# Altium footprint library ThanhNT.PcbLib: 579 footprints (part 21 of 37)
Each footprint in its own frame and in the unit in brackets; x right, y up, seen from the top. Pads: shape width x height; smd on the part's side, far side on the other; paste and mask are expansions set on the pad; w line width, h text height; cw(c..) or ccw(c..) is an arc to the next point about the centre after c.
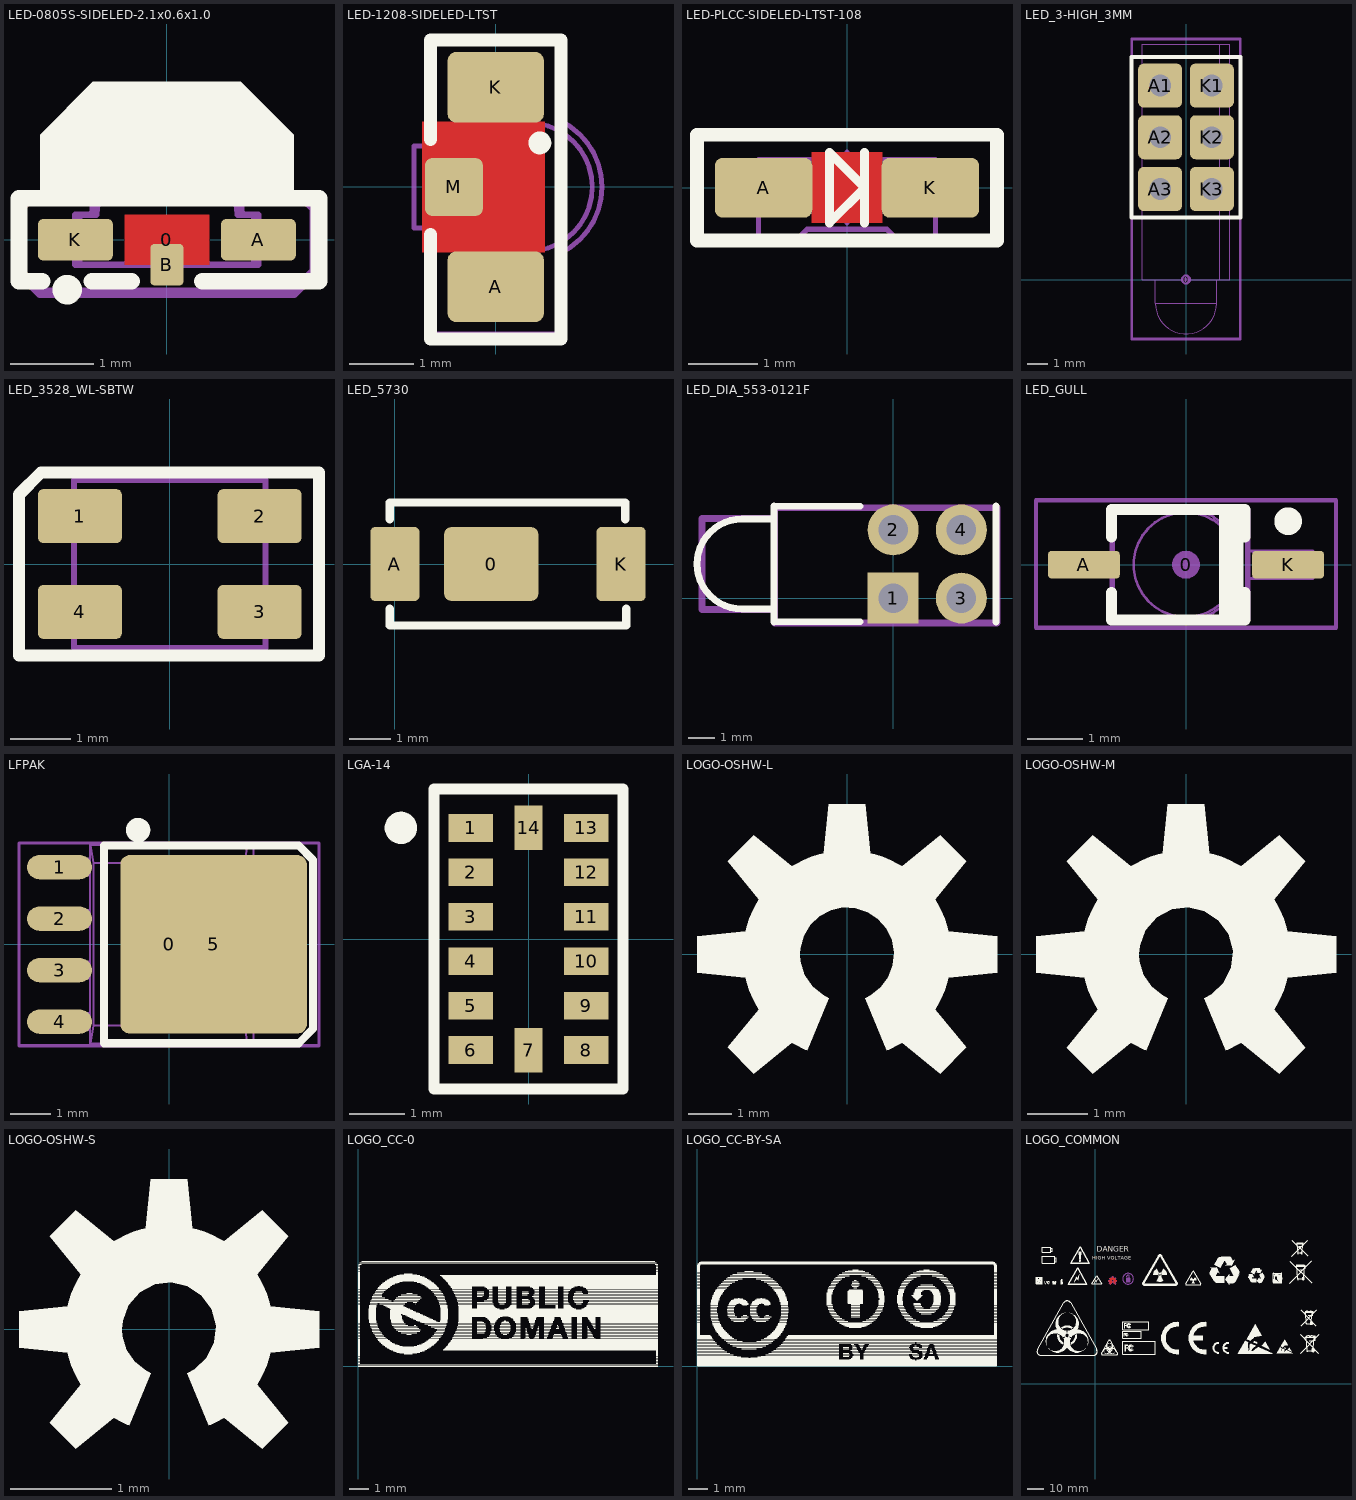
[diagram p20: the footprints below, top view; thin cyan lines are the x and y axes]

## LED-0805S-SIDELED-2.1x0.6x1.0 [mm] "Lite-On Inc PLCC Side LED"
height 0.8
pads (4):
  round 0.508 on Mech15: 0(0,0)
  rrect25% 0.9x0.5 smd: A(1.1,0) K(-1.1,0)
  rrect25% 0.4x0.5 smd: B(0,-0.3)
Top Layer:
  pour cut-out: -0.508,0.3 0.508,0.3 0.508,-0.3 -0.508,-0.3
Top Overlay:
  circle w0.203: c-1.2,-0.6 r0.076
  region: -1.524,0.5 1.524,0.5 1.524,1.262 0.889,1.897 -0.889,1.897 -1.524,1.262
  lines w0.2: -1.5,-0.5 -1.778,-0.5 -1.778,0.5 1.829,0.5 1.829,-0.5 0.425,-0.5 ; -0.9,-0.5 -0.425,-0.5
Mechanical 13:
  lines w0.076: -1.05,-0.3 1.05,-0.3 1.05,0.3 0.85,0.3 ccw(c0.3,0.3) 0.3,0.85 -0.3,0.85 ccw(c-0.3,0.3) -0.85,0.3 -1.05,0.3 -1.05,-0.3
Mechanical 15:
  lines w0.076: -1.1,-0.3 -1.1,0.3 -0.9,0.3 cw(c-0.35,0.3) -0.35,0.85 0.35,0.85 cw(c0.35,0.3) 0.9,0.3 1.1,0.3 1.1,-0.3 -1.1,-0.3
  lines w0.127: -1.778,-0.381 -1.524,-0.635 1.524,-0.635 1.778,-0.381 1.778,0.381 1.651,0.508 1.27,0.508 0.762,1.016 -0.762,1.016 -1.27,0.508 -1.651,0.508 -1.778,0.381 -1.778,-0.381
3D body "LED_SIDELED-2.1x0.6x1.0 WHITE maxtol.STEP": height 0.7, standoff 0, extent -1.1,-0.3 1.1,0.8

## LED-1208-SIDELED-LTST [mm] "Lite-On Inc 1208 SMD Side LED"
height 1
pads (3):
  rrect25% 1.5x1.1 smd: A(0,-1.55) K(0,1.55)
  rrect25% 0.9x0.9 smd: M(-0.65,0)
Top Layer:
  pour cut-out: -1.143,1.016 0.762,1.016 0.762,-1.016 -1.143,-1.016
Top Overlay:
  circle w0.203: c0.686,0.686 r0.076
  lines w0.2: -1.016,-0.737 -1.016,-2.362 1.016,-2.362 1.016,2.286 -1.016,2.286 -1.016,0.737
Mechanical 13:
  lines w0.076: -0.5,-1.5 0.5,-1.5 0.5,-1 ccw(c0.5,0) 1.5,0 ccw(c0.5,0) 0.5,1 0.5,1.5 -0.5,1.5 -0.5,-1.5
Mechanical 15:
  lines w0.076: -0.508,0 0.508,0 ; 0,-0.508 0,0.508 ; 1.009,-1.027 ccw(c0.508,0) 1.009,1.027 ; 1.016,-1.023 1.016,-2.286 -1.016,-2.286 -1.016,-0.635 -1.27,-0.635 -1.27,0.635 -1.016,0.635 -1.016,2.286 1.016,2.286 1.016,1.023
3D body: height 1, standoff 0, extent 0.5,-1 1.5,1
3D body: height 1, standoff 0, extent -0.5,-1.5 0.5,1.5

## LED-PLCC-SIDELED-LTST-108 [mm] "Lite-On Inc PLCC Side LED"
height 0.8
pads (2):
  rrect25% 1.4x0.86 smd: A(-1.2,0) K(1.2,0)
Top Layer:
  pour cut-out: -0.508,0.508 0.508,0.508 0.508,-0.508 -0.508,-0.508
Top Overlay:
  lines w0.127: 0.254,-0.508 0.254,0.508 ; -0.254,-0.508 -0.254,0.508 0.254,0 -0.254,-0.508
  lines w0.2: -2.159,-0.762 2.159,-0.762 2.159,0.762 -2.159,0.762 -2.159,-0.762
Mechanical 13:
  lines w0.076: -1.275,-0.8 -1.275,0.4 1.275,0.4 1.275,-0.8 0.775,-0.8 0.575,-0.6 -0.575,-0.6 -0.775,-0.8 -1.275,-0.8
Mechanical 15:
  lines w0.076: -0.508,0 0.508,0 ; 0,-0.508 0,0.508 ; -2.159,-0.762 2.159,-0.762 2.159,0.762 -2.159,0.762 -2.159,-0.762
3D body: height 0.15, standoff 0, extent 0.725,-0.3 1.425,0.3
3D body: height 0.15, standoff 0, extent -1.425,-0.3 -0.725,0.3
3D body: height 0.8, standoff 0, extent -1.275,-0.8 1.275,0.4

## LED_3-HIGH_3MM [mil] "LED Circuit Board Indicator Tri-Level"
height 600
pads (7):
  round 20 on Mech15: 0(0,0)
  rrect25% 85x85 hole 42: A1(-50,375) A2(-50,275) A3(-50,175) K1(50,375) K2(50,275) K3(50,175)
Top Overlay:
  lines w7.87: -105,120 105,120 105,430 -105,430 -105,120
Mechanical 13:
  lines w1.97: -59.06,0 -59.06,-46.06 ; 59.06,0 59.06,-46.06 ; 65.35,0 65.35,455.12 ; -59.06,-46.06 ccw(c0,-46.06) 59.06,-46.06 ; -59.06,-46.06 59.06,-46.06 ; -85.04,0 85.04,0 85.04,455.12 -85.04,455.12 -85.04,0
Mechanical 15:
  lines w5: -105,-115 105,-115 105,465 -105,465 -105,-115
3D body "LED bar 3-high 3mm.STEP": height 600, standoff -144.88, extent -85.04,-105.11 85.04,455.12

## LED_3528_WL-SBTW [mm]
pads (4):
  rrect20% 1.4x0.9 smd: 1(-1.499,0.799) 2(1.499,0.799) 3(1.499,-0.799) 4(-1.499,-0.799)
Top Overlay:
  lines w0.2: -2.515,-1.524 2.489,-1.524 2.489,1.524 -2.15,1.524 -2.515,1.159 -2.515,-1.524
Mechanical 13:
  lines w0.1: -1.6,-1.4 -1.6,1.4 1.6,1.4 1.6,-1.4 -1.6,-1.4
3D body "150141xxx.stp": height 1.87, standoff -0.03, extent -1.75,-1.4 1.75,1.4

## LED_5730 [mm]
pads (3):
  rrect20% 2.3x1.8 smd: 0(2.348,0)
  rrect20% 1.2x1.8 smd: A(0,0) K(5.512,0)
Top Overlay:
  lines w0.2: -0.127,-1.092 -0.127,-1.499 5.639,-1.499 5.639,-1.092 ; -0.127,1.092 -0.127,1.499 5.613,1.499 5.613,1.092
3D body "User Library-PLCC-2white.STEP": height 0.9, standoff 0, extent -0.087,-1.5 5.613,1.5

## LED_DIA_553-0121F [mm]
pads (4):
  rect 1.9x1.9 hole 1.1: 1(0,0)
  round 1.9 hole 1.1: 2(0,2.54) 3(2.54,0) 4(2.54,2.54)
Top Overlay:
  lines w0.254: -4.445,-0.889 -4.445,3.429 ; -4.445,-0.406 -5.639,-0.406 cw(c-5.639,1.27) -5.639,2.946 -4.445,2.946 ; -4.43,-0.88 -1.23,-0.88 ; -4.43,3.42 -1.23,3.42 ; 3.833,-0.889 3.833,3.429
Mechanical 16:
  lines w0.254: -4.43,-0.43 -7.13,-0.43 -7.13,2.97 -4.43,2.97 ; -4.43,-0.93 -4.43,3.37 3.87,3.37 3.87,-0.93 -4.43,-0.93
3D body "55307XXF.stp": height 9.65, standoff -3.68, extent -7.28,-0.898 3.718,3.42

## LED_GULL [mm]
pads (3):
  round 0.508 on Mech15: 0(0,0)
  rrect25% 1.3x0.5 smd: A(-1.85,0) K(1.85,0)
Top Overlay:
  circle w0.4: c1.85,0.788 r0.05
  rectangle: 0.6,-1 1.041,1
  lines w0.2: -1.35,-0.5 -1.35,-1 1.067,-1 1.067,-0.5 ; -1.35,0.5 -1.35,1 1.067,1 1.067,0.5
Mechanical 13:
  circle w0.05: c0,0 r0.95
  lines w0.05: -1.9,-0.2 -1.9,0.2 ; -1.77,-0.2 -1.77,0.2 ; -1.499,-0.2 -1.499,0.2 ; -1.36,-0.2 -2.3,-0.2 -2.3,0.2 -1.36,0.2 ; -1.31,-1 -1.31,1 ; -0.001,-1 ccw(c0,0) 0.001,1 ; 1.09,-1 1.09,1 ; 1.14,-0.25 2.3,-0.25 2.3,0.25 1.14,0.25 ; 1.23,-0.25 1.23,0.25 ; 1.499,-0.25 1.499,0.25 ; 1.77,-0.25 1.77,0.25 ; 1.9,-0.25 1.9,0.25 ; -1.36,-1 1.14,-1 1.14,1 -1.36,1 -1.36,-1
Mechanical 15:
  lines w0.076: -2.718,-1.143 -2.718,1.168 2.718,1.168 2.718,-1.143 -2.718,-1.143
3D body "LED_GullWing.STEP": height 2.76, standoff 0, extent -2.3,-1 2.3,1

## LFPAK [mm] "Renesas LFPAK, a variant of SOIC-8; IPC Medium Density"
height 1.1
pads (6):
  round 1 on Mech15: 0(0,0)
  oval 1.6x0.6 smd: 1(-2.7,1.905) 2(-2.7,0.635) 3(-2.7,-0.635) 4(-2.7,-1.905)
  rrect10% 4.6x4.4 smd paste-0.8: 5(1.1,0)
Top Overlay:
  circle w0.3: c-0.762,2.819 r0.15
  lines w0.2: -1.6,-2.438 3.2,-2.438 3.556,-2.083 3.556,2.083 3.2,2.438 -1.6,2.438 -1.6,-2.438
Mechanical 13:
  circle w0.05: c0,1.5 r0.338
  lines w0.05: -2.631,-2.115 -2.631,-1.695 ; -2.631,-0.845 -2.631,-0.425 ; -2.631,0.425 -2.631,0.845 ; -2.631,1.695 -2.631,2.115 ; -2.543,-2.115 -2.543,-1.695 ; -2.543,-0.845 -2.543,-0.425 ; -2.543,0.425 -2.543,0.845 ; -2.543,1.695 -2.543,2.115 ; -2.506,-2.115 -2.506,-1.695 ; -2.506,-0.845 -2.506,-0.425 ; -2.506,0.425 -2.506,0.845 ; -2.506,1.695 -2.506,2.115 ; -2.217,-2.115 -2.217,-1.695 ; -2.217,-0.845 -2.217,-0.425 ; -2.217,0.425 -2.217,0.845 ; -2.217,1.695 -2.217,2.115 ; -1.95,-2.115 -3,-2.115 -3,-1.695 -1.95,-1.695 ; -1.95,-0.845 -3,-0.845 -3,-0.425 -1.95,-0.425 ; -1.95,0.425 -3,0.425 -3,0.845 -1.95,0.845 ; -1.95,1.695 -3,1.695 -3,2.115 -1.95,2.115 ; -1.937,-2.45 -1.858,-2.003 ; -1.937,2.45 -1.858,2.003 ; 1.937,-2.45 1.858,-2.003 ; 1.937,2.45 1.858,2.003 ; 2.085,-1.4 2.085,-2.358 1.993,-2.45 -1.95,-2.45 -1.95,2.45 1.993,2.45 2.085,2.358 2.085,1.4 ; 2.085,-0.6 2.085,0.6 ; -1.858,-2.003 1.858,-2.003 ; -1.858,-2.003 -1.858,2.003 ; -1.858,2.003 1.858,2.003 ; 1.858,-2.003 1.858,2.003 ; 2.028,-1.4 2.028,-0.6 2.1,-0.6 2.1,0.6 2.028,0.6 2.028,1.4 2.3,1.4 2.3,2.1 2.55,2.1 3,1.65 3,-1.65 2.55,-2.1 2.3,-2.1 2.3,-1.4 2.028,-1.4
Mechanical 15:
  lines w0.076: -3.7,-2.5 3.7,-2.5 3.7,2.5 -3.7,2.5 -3.7,-2.5
3D body "LFPAK.STEP": height 1.1, standoff 0, extent -3,-2.45 3,2.45

## LGA-14 [mm]
pads (14):
  rect 0.8x0.5 smd: 1(-1.041,2.007) 2(-1.041,1.207) 3(-1.041,0.407) 4(-1.041,-0.393) 5(-1.041,-1.193) 6(-1.041,-1.993) 8(1.039,-1.993) 9(1.039,-1.193) 10(1.039,-0.393) 11(1.039,0.407) 12(1.039,1.207) 13(1.039,2.007)
  rect 0.5x0.8 smd: 7(-0.001,-1.993) 14(-0.001,2.007)
Top Overlay:
  circle w0.3: c-2.301,2.007 r0.141
  lines w0.2: -1.701,-2.693 -1.701,2.707 1.699,2.707 1.699,-2.693 0.199,-2.693 -1.701,-2.693
3D body "SW3dPS-LGA-14.STEP": height 1.03, standoff -0.4, extent -1.506,-2.493 1.494,2.507

## LOGO-OSHW-L [mm] "Open Source - Hardware"
Top Overlay:
  region: 0.921,-2.223 0.967,-2.204 1.058,-2.162 1.146,-2.116 1.233,-2.067 1.275,-2.041 2.155,-2.758 2.758,-2.155 2.041,-1.275 2.094,-1.19 2.185,-1.013 2.261,-0.829 2.322,-0.639 2.345,-0.541 3.474,-0.426 3.474,0.426 2.345,0.541 2.322,0.639 2.261,0.829 2.185,1.013 2.094,1.19 2.041,1.275 2.758,2.155 2.155,2.758 1.275,2.041 1.19,2.094 1.013,2.185 0.829,2.261 0.639,2.322 0.541,2.345 0.426,3.474 -0.426,3.474 -0.541,2.345 -0.639,2.322 -0.829,2.261 -1.013,2.185 -1.19,2.094 -1.275,2.041 -2.155,2.758 -2.758,2.155 -2.041,1.275 -2.094,1.19 -2.185,1.013 -2.261,0.829 -2.322,0.639 -2.345,0.541 -3.474,0.426 -3.474,-0.426 -2.345,-0.541 -2.322,-0.639 -2.261,-0.829 -2.185,-1.013 -2.094,-1.19 -2.041,-1.275 -2.758,-2.155 -2.155,-2.758 -1.275,-2.041 -1.233,-2.067 -1.146,-2.116 -1.058,-2.162 -0.967,-2.204 -0.921,-2.223 -0.419,-1.01 -0.562,-0.938 -0.81,-0.734 -0.989,-0.468 -1.082,-0.16 -1.094,0 -1.084,0.147 -1.005,0.431 -0.854,0.683 -0.641,0.886 -0.381,1.025 -0.094,1.09 0.2,1.075 0.48,0.983 0.724,0.819 0.917,0.596 1.043,0.33 1.093,0.04 1.064,-0.253 0.958,-0.527 0.783,-0.764 0.551,-0.945 0.419,-1.01

## LOGO-OSHW-M [mm] "Open Source - Hardware"
Top Overlay:
  region: 0.658,-1.588 0.691,-1.574 0.755,-1.544 0.819,-1.512 0.881,-1.477 0.911,-1.458 1.539,-1.97 1.97,-1.539 1.458,-0.911 1.495,-0.85 1.561,-0.724 1.615,-0.592 1.659,-0.456 1.675,-0.387 2.481,-0.305 2.481,0.305 1.675,0.387 1.659,0.456 1.615,0.592 1.561,0.724 1.495,0.85 1.458,0.911 1.97,1.539 1.539,1.97 0.911,1.458 0.85,1.495 0.724,1.561 0.592,1.615 0.456,1.659 0.387,1.675 0.305,2.481 -0.305,2.481 -0.387,1.675 -0.456,1.659 -0.592,1.615 -0.724,1.561 -0.85,1.495 -0.911,1.458 -1.539,1.97 -1.97,1.539 -1.458,0.911 -1.495,0.85 -1.561,0.724 -1.615,0.592 -1.659,0.456 -1.675,0.387 -2.481,0.305 -2.481,-0.305 -1.675,-0.387 -1.659,-0.456 -1.615,-0.592 -1.561,-0.724 -1.495,-0.85 -1.458,-0.911 -1.97,-1.539 -1.539,-1.97 -0.911,-1.458 -0.881,-1.477 -0.819,-1.512 -0.755,-1.544 -0.691,-1.574 -0.658,-1.588 -0.299,-0.722 -0.402,-0.67 -0.579,-0.525 -0.706,-0.334 -0.773,-0.115 -0.781,0 -0.769,0.14 -0.67,0.402 -0.486,0.612 -0.239,0.744 0.038,0.78 0.311,0.717 0.543,0.561 0.706,0.334 0.779,0.064 0.751,-0.215 0.628,-0.465 0.423,-0.657 0.299,-0.722

## LOGO-OSHW-S [mm] "Open Source - Hardware"
Top Overlay:
  region: 0.395,-0.953 0.414,-0.945 0.453,-0.927 0.491,-0.907 0.528,-0.886 0.547,-0.875 0.924,-1.182 1.182,-0.924 0.875,-0.547 0.897,-0.51 0.936,-0.434 0.969,-0.355 0.995,-0.274 1.005,-0.232 1.489,-0.183 1.489,0.183 1.005,0.232 0.995,0.274 0.969,0.355 0.936,0.434 0.897,0.51 0.875,0.547 1.182,0.924 0.924,1.182 0.547,0.875 0.51,0.897 0.434,0.936 0.355,0.969 0.274,0.995 0.232,1.005 0.183,1.489 -0.183,1.489 -0.232,1.005 -0.274,0.995 -0.355,0.969 -0.434,0.936 -0.51,0.897 -0.547,0.875 -0.924,1.182 -1.182,0.924 -0.875,0.547 -0.897,0.51 -0.936,0.434 -0.969,0.355 -0.995,0.274 -1.005,0.232 -1.489,0.183 -1.489,-0.183 -1.005,-0.232 -0.995,-0.274 -0.969,-0.355 -0.936,-0.434 -0.897,-0.51 -0.875,-0.547 -1.182,-0.924 -0.924,-1.182 -0.547,-0.875 -0.528,-0.886 -0.491,-0.907 -0.453,-0.927 -0.414,-0.945 -0.395,-0.953 -0.179,-0.433 -0.241,-0.402 -0.347,-0.315 -0.424,-0.2 -0.464,-0.069 -0.469,0 -0.461,0.084 -0.402,0.241 -0.292,0.367 -0.144,0.446 0.023,0.468 0.186,0.43 0.326,0.337 0.424,0.2 0.467,0.038 0.451,-0.129 0.376,-0.279 0.254,-0.394 0.179,-0.433

## LOGO_CC-0 [mm]
Top Overlay:
  drawing of 1096 lines, arcs and shapes, not listed

## LOGO_CC-BY-SA [mm]
Top Overlay:
  drawing of 1065 lines, arcs and shapes, not listed

## LOGO_COMMON [mm]
Top Layer:
  region: 11.26,61.633 11.294,61.646 11.359,61.677 11.424,61.71 11.486,61.746 11.517,61.765 12.156,61.244 12.593,61.682 12.073,62.321 12.111,62.382 12.177,62.511 12.233,62.645 12.277,62.783 12.293,62.853 13.113,62.936 13.113,63.556 12.293,63.639 12.277,63.709 12.233,63.847 12.177,63.981 12.111,64.11 12.073,64.171 12.593,64.81 12.156,65.248 11.517,64.727 11.456,64.765 11.327,64.832 11.193,64.887 11.055,64.931 10.984,64.948 10.901,65.767 10.282,65.767 10.199,64.948 10.129,64.931 9.991,64.887 9.857,64.832 9.728,64.765 9.666,64.727 9.028,65.248 8.59,64.81 9.111,64.171 9.073,64.11 9.006,63.981 8.951,63.847 8.907,63.709 8.89,63.639 8.071,63.556 8.071,62.936 8.89,62.853 8.907,62.783 8.951,62.645 9.006,62.511 9.073,62.382 9.111,62.321 8.59,61.682 9.028,61.244 9.666,61.765 9.697,61.746 9.76,61.71 9.824,61.677 9.89,61.646 9.924,61.633 10.288,62.513 10.184,62.565 10.004,62.713 9.874,62.907 9.807,63.13 9.798,63.246 9.805,63.353 9.862,63.559 9.972,63.742 10.127,63.889 10.315,63.99 10.524,64.037 10.737,64.026 10.94,63.959 11.117,63.841 11.257,63.679 11.348,63.486 11.385,63.275 11.364,63.063 11.287,62.863 11.16,62.692 10.991,62.56 10.896,62.513
Top Overlay:
  drawing of 728 lines, arcs and shapes, not listed
  text "HIGH VOLTAGE" at -1.88,75.413 h3.94
  text "DANGER" at 0.66,79.858 h5.91
Mechanical 16:
  circle w0.61: c20.091,64.516 r3.302
  region: 21.361,62.789 21.361,62.728 21.315,62.616 21.229,62.53 21.117,62.484 21.057,62.484 19.075,62.484 19.025,62.484 18.932,62.523 18.86,62.594 18.821,62.687 18.821,62.738 18.821,64.77 18.821,64.821 18.86,64.914 18.932,64.985 19.025,65.024 19.075,65.024 21.057,65.024 21.117,65.024 21.229,64.978 21.315,64.892 21.361,64.78 21.361,64.719
  lines w0.254: 8.071,62.936 8.071,63.556 8.89,63.639 cw(c10.592,63.246) 9.111,64.171 8.59,64.81 9.028,65.248 9.666,64.727 cw(c10.592,63.246) 10.199,64.948 10.282,65.767 10.901,65.767 10.984,64.948 cw(c10.591,63.246) 11.517,64.727 12.156,65.248 12.593,64.81 12.073,64.171 cw(c10.592,63.246) 12.293,63.639 13.113,63.556 13.113,62.936 12.293,62.853 cw(c10.592,63.246) 12.073,62.321 12.593,61.682 12.156,61.244 11.517,61.765 cw(c10.591,63.246) 11.26,61.633 10.896,62.513 ccw(c10.592,63.246) 9.798,63.246 ccw(c10.592,63.246) 10.288,62.513 9.924,61.633 cw(c10.593,63.246) 9.666,61.765 9.028,61.244 8.59,61.682 9.111,62.321 cw(c10.592,63.246) 8.89,62.853 8.071,62.936
  lines w0.406: 19.329,65.786 19.329,66.04 cw(c20.091,66.04) 20.091,66.802 cw(c20.091,66.04) 20.853,66.04 20.853,65.024